# Altium footprint library LUMI_Standard_Auto_Soldering_LIB.PcbLib: 344 footprints (part 8 of 22)
Each footprint in its own frame and in the unit in brackets; x right, y up, seen from the top. Pads: shape width x height; smd on the part's side, far side on the other; paste and mask are expansions set on the pad; w line width, h text height; cw(c..) or ccw(c..) is an arc to the next point about the centre after c.
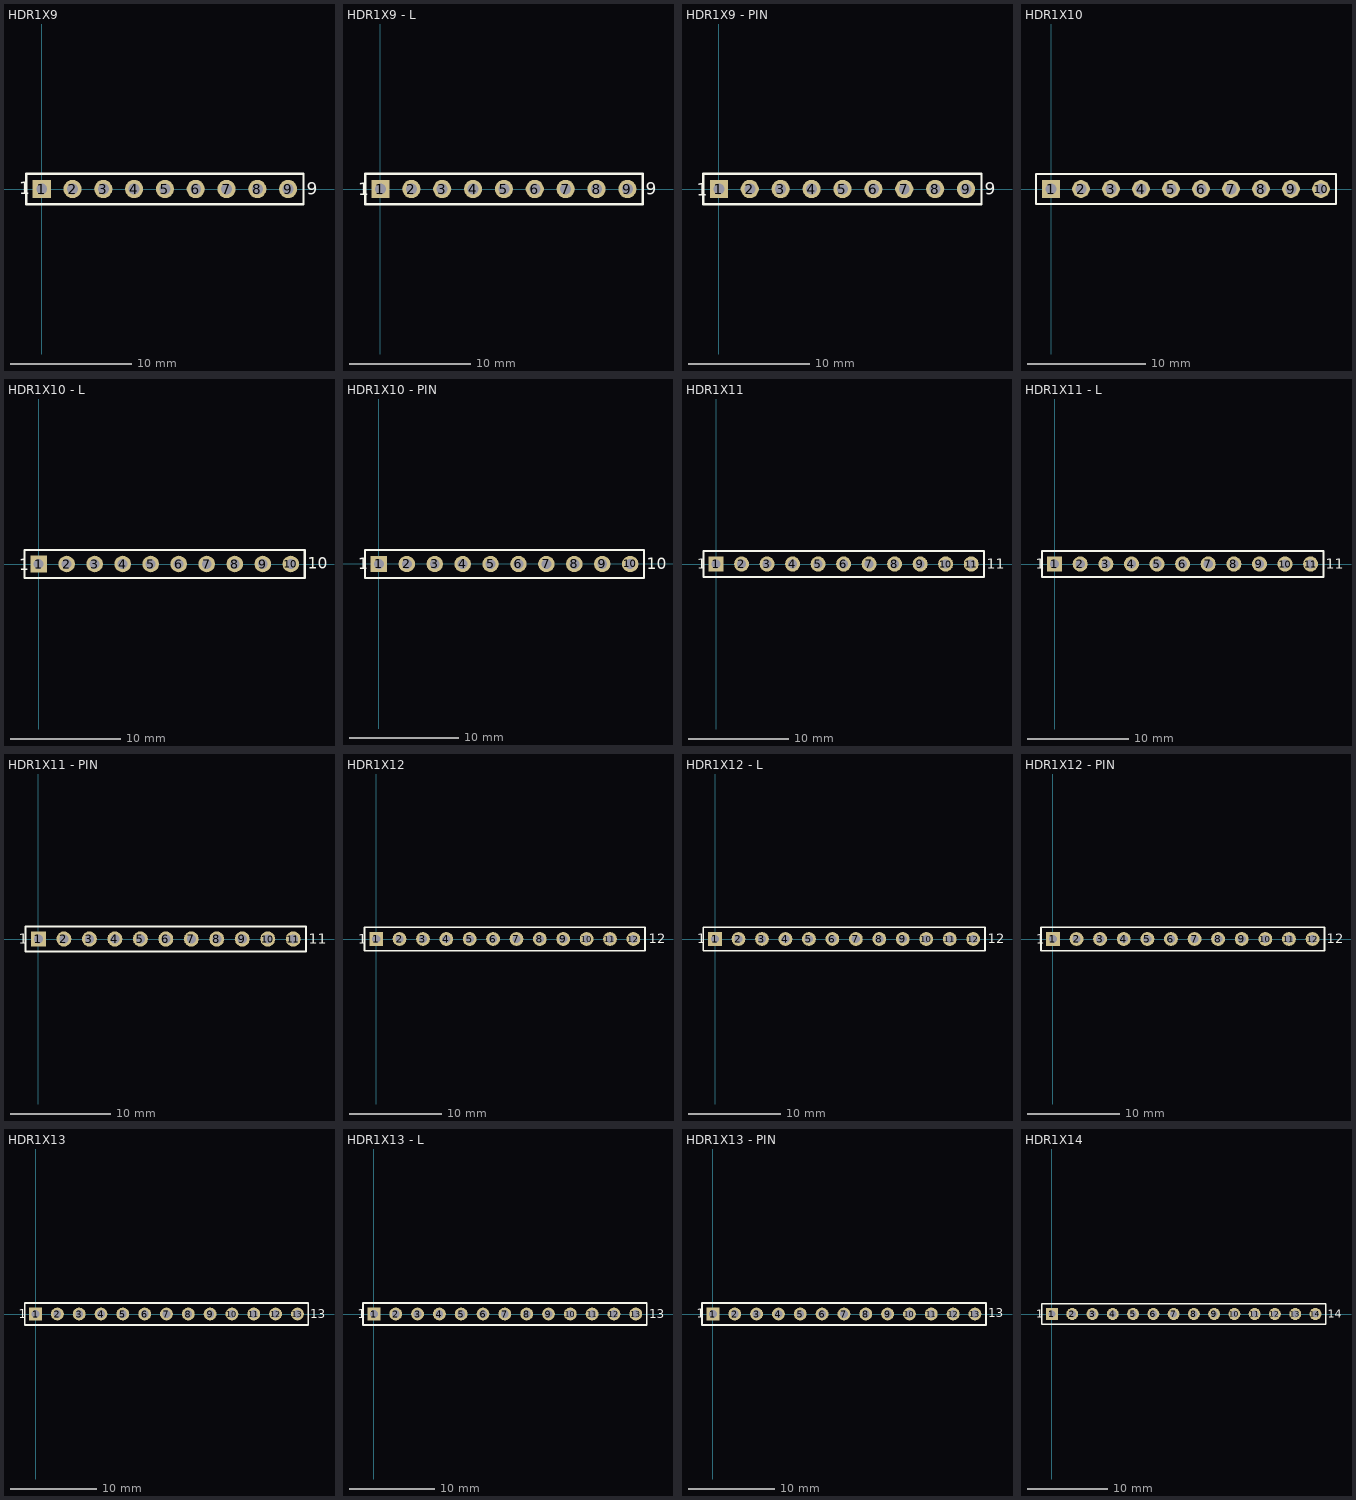
[diagram p7: the footprints below, top view; thin cyan lines are the x and y axes]

## HDR1X9 [mm] "Connector; Header; 9 Position"
pads (9):
  rect 1.5x1.5 hole 0.9: 1(0,0)
  round 1.5 hole 0.9: 2(2.54,0) 3(5.08,0) 4(7.62,0) 5(10.16,0) 6(12.7,0) 7(15.24,0) 8(17.78,0) 9(20.32,0)
Top Overlay:
  lines w0.2: -1.27,-1.27 21.59,-1.27 21.59,1.27 -1.27,1.27 -1.27,-1.27
  text "1" at -1.875,-0.45 h1.02
  text "9" at 21.85,-0.475 h1.02
3D body: height 8.55, standoff -2.43, extent -1.208,-1.314 3.872,1.226
3D body: height 8.55, standoff -2.43, extent 3.785,-1.295 8.865,1.245
3D body: height 8.52, standoff -2.48, extent 8.89,-1.25 21.59,1.25

## HDR1X9 - L [mm] "Connector; Header; 9 Position"
pads (9):
  rect 1.5x1.5 hole 0.9: 1(0,0)
  round 1.5 hole 0.9: 2(2.54,0) 3(5.08,0) 4(7.62,0) 5(10.16,0) 6(12.7,0) 7(15.24,0) 8(17.78,0) 9(20.32,0)
Top Overlay:
  lines w0.2: -1.27,-1.27 21.59,-1.27 21.59,1.27 -1.27,1.27 -1.27,-1.27
  text "9" at 21.825,-0.475 h1.02
  text "1" at -1.85,-0.5 h1.02
3D body: height 4.33, standoff -3, extent 8.89,-1.27 21.59,7
3D body: height 4.33, standoff -3, extent -1.092,-1.265 9.068,7.005

## HDR1X9 - PIN [mm] "Connector; Header; 9 Position"
pads (9):
  rect 1.5x1.5 hole 0.9: 1(0,0)
  round 1.5 hole 0.9: 2(2.54,0) 3(5.08,0) 4(7.62,0) 5(10.16,0) 6(12.7,0) 7(15.24,0) 8(17.78,0) 9(20.32,0)
Top Overlay:
  lines w0.2: -1.27,-1.27 21.59,-1.27 21.59,1.27 -1.27,1.27 -1.27,-1.27
  text "9" at 21.85,-0.475 h1.02
  text "1" at -1.8,-0.55 h1.02
3D body: height 6.02, standoff -3.1, extent -1.143,-1.245 6.477,1.295
3D body: height 6.02, standoff -3.1, extent 6.401,-1.245 14.021,1.295
3D body: height 6.02, standoff -3.1, extent 13.97,-1.245 21.59,1.295

## HDR1X10 [mm] "Connector; Header; 10 Position"
pads (10):
  rect 1.5x1.5 hole 0.9: 1(0,0)
  round 1.5 hole 0.9: 2(2.54,0) 3(5.08,0) 4(7.62,0) 5(10.16,0) 6(12.7,0) 7(15.24,0) 8(17.78,0) 9(20.32,0) 10(22.86,0)
Top Overlay:
  lines w0.2: -1.27,-1.27 -1.27,1.27 0.635,1.27 24.13,1.27 24.13,-1.27 -1.27,-1.27
3D body: height 8.55, standoff -2.43, extent 19.075,-1.27 24.155,1.27
3D body: height 8.55, standoff -2.43, extent 13.995,-1.27 19.075,1.27
3D body: height 8.55, standoff -2.43, extent 8.966,-1.295 14.046,1.245
3D body: height 8.55, standoff -2.43, extent 3.861,-1.295 8.941,1.245
3D body: height 8.55, standoff -2.43, extent -1.118,-1.321 3.962,1.219

## HDR1X10 - L [mm] "Connector; Header; 10 Position"
pads (10):
  rect 1.5x1.5 hole 0.9: 1(0,0)
  round 1.5 hole 0.9: 2(2.54,0) 3(5.08,0) 4(7.62,0) 5(10.16,0) 6(12.7,0) 7(15.24,0) 8(17.78,0) 9(20.32,0) 10(22.86,0)
Top Overlay:
  lines w0.2: -1.27,-1.27 -1.27,1.27 0.635,1.27 24.13,1.27 24.13,-1.27 -1.27,-1.27
  text "10" at 24.4,-0.425 h1.02
  text "1" at -1.775,-0.55 h1.02
3D body: height 4.33, standoff -3, extent 11.43,-1.27 24.13,7
3D body: height 4.33, standoff -3, extent -1.27,-1.27 11.43,7

## HDR1X10 - PIN [mm] "Connector; Header; 10 Position"
pads (10):
  rect 1.5x1.5 hole 0.9: 1(0,0)
  round 1.5 hole 0.9: 2(2.54,0) 3(5.08,0) 4(7.62,0) 5(10.16,0) 6(12.7,0) 7(15.24,0) 8(17.78,0) 9(20.32,0) 10(22.86,0)
Top Overlay:
  lines w0.2: -1.27,-1.27 24.13,-1.27 24.13,1.27 0.635,1.27 -1.27,1.27 -1.27,-1.27
  text "1" at -1.9,-0.475 h1.02
  text "10" at 24.375,-0.475 h1.02
3D body: height 6.02, standoff -3.1, extent 13.919,-1.295 24.079,1.245
3D body: height 6.02, standoff -3.1, extent 6.299,-1.295 13.919,1.245
3D body: height 6.02, standoff -3.1, extent -1.295,-1.27 6.325,1.27

## HDR1X11 [mm] "Connector; Header; 11 Position"
pads (11):
  rect 1.5x1.5 hole 0.9: 1(0,0)
  round 1.5 hole 0.9: 2(2.54,0) 3(5.08,0) 4(7.62,0) 5(10.16,0) 6(12.7,0) 7(15.24,0) 8(17.78,0) 9(20.32,0) 10(22.86,0) 11(25.4,0)
Top Overlay:
  lines w0.2: -1.27,-1.27 -1.27,1.27 0.635,1.27 26.67,1.27 26.67,-1.27 -1.27,-1.27
  text "11" at 26.95,-0.45 h1.02
  text "1" at -1.9,-0.45 h1.02
3D body: height 8.52, standoff -2.48, extent 13.97,-1.25 26.67,1.25
3D body: height 8.55, standoff -2.43, extent 8.901,-1.263 13.981,1.277
3D body: height 8.55, standoff -2.43, extent 3.897,-1.314 8.977,1.226
3D body: height 8.55, standoff -2.43, extent -1.168,-1.346 3.912,1.194

## HDR1X11 - L [mm] "Connector; Header; 11 Position"
pads (11):
  rect 1.5x1.5 hole 0.9: 1(0,0)
  round 1.5 hole 0.9: 2(2.54,0) 3(5.08,0) 4(7.62,0) 5(10.16,0) 6(12.7,0) 7(15.24,0) 8(17.78,0) 9(20.32,0) 10(22.86,0) 11(25.4,0)
Top Overlay:
  lines w0.2: -1.27,-1.27 26.67,-1.27 26.67,1.27 0.635,1.27 -1.27,1.27 -1.27,-1.27
  text "1" at -1.85,-0.45 h1.02
  text "11" at 26.9,-0.475 h1.02
3D body: height 4.33, standoff -3, extent 11.456,-1.27 26.696,7
3D body: height 4.33, standoff -3, extent -1.27,-1.27 11.43,7

## HDR1X11 - PIN [mm] "Connector; Header; 11 Position"
pads (11):
  rect 1.5x1.5 hole 0.9: 1(0,0)
  round 1.5 hole 0.9: 2(2.54,0) 3(5.08,0) 4(7.62,0) 5(10.16,0) 6(12.7,0) 7(15.24,0) 8(17.78,0) 9(20.32,0) 10(22.86,0) 11(25.4,0)
Top Overlay:
  lines w0.2: -1.27,-1.27 -1.27,1.27 0.635,1.27 26.67,1.27 26.67,-1.27 -1.27,-1.27
  text "11" at 26.95,-0.475 h1.02
  text "1" at -1.925,-0.475 h1.02
3D body: height 6.02, standoff -3.1, extent -1.295,-1.27 6.325,1.27
3D body: height 6.02, standoff -3.1, extent 6.325,-1.27 16.485,1.27
3D body: height 6.02, standoff -3.1, extent 16.485,-1.27 26.645,1.27

## HDR1X12 [mm] "Connector; Header; 12 Position"
pads (12):
  rect 1.5x1.5 hole 0.9: 1(0,0)
  round 1.5 hole 0.9: 2(2.54,0) 3(5.08,0) 4(7.62,0) 5(10.16,0) 6(12.7,0) 7(15.24,0) 8(17.78,0) 9(20.32,0) 10(22.86,0) 11(25.4,0) 12(27.94,0)
Top Overlay:
  lines w0.2: -1.27,-1.27 29.21,-1.27 29.21,1.27 0.635,1.27 -1.27,1.27 -1.27,-1.27
  text "1" at -1.975,-0.525 h1.02
  text "12" at 29.6,-0.45 h1.02
3D body: height 8.55, standoff -2.43, extent -1.041,-1.27 4.039,1.27
3D body: height 8.55, standoff -2.43, extent 3.962,-1.295 9.042,1.245
3D body: height 8.55, standoff -2.43, extent 9.079,-1.289 14.159,1.251
3D body: height 8.55, standoff -2.43, extent 14.032,-1.263 19.112,1.277
3D body: height 8.55, standoff -2.43, extent 19.112,-1.289 24.192,1.251
3D body: height 8.55, standoff -2.43, extent 24.105,-1.27 29.185,1.27

## HDR1X12 - L [mm] "Connector; Header; 12 Position"
pads (12):
  rect 1.5x1.5 hole 0.9: 1(0,0)
  round 1.5 hole 0.9: 2(2.54,0) 3(5.08,0) 4(7.62,0) 5(10.16,0) 6(12.7,0) 7(15.24,0) 8(17.78,0) 9(20.32,0) 10(22.86,0) 11(25.4,0) 12(27.94,0)
Top Overlay:
  lines w0.2: -1.27,-1.27 -1.27,1.27 0.635,1.27 29.21,1.27 29.21,-1.27 -1.27,-1.27
  text "12" at 29.5,-0.45 h1.02
  text "1" at -1.95,-0.45 h1.02
3D body: height 4.33, standoff -3, extent -1.27,-1.244 13.97,7.026
3D body: height 4.33, standoff -3, extent 13.97,-1.244 29.21,7.026

## HDR1X12 - PIN [mm] "Connector; Header; 12 Position"
pads (12):
  rect 1.5x1.5 hole 0.9: 1(0,0)
  round 1.5 hole 0.9: 2(2.54,0) 3(5.08,0) 4(7.62,0) 5(10.16,0) 6(12.7,0) 7(15.24,0) 8(17.78,0) 9(20.32,0) 10(22.86,0) 11(25.4,0) 12(27.94,0)
Top Overlay:
  lines w0.2: -1.27,-1.27 29.21,-1.27 29.21,1.27 0.635,1.27 -1.27,1.27 -1.27,-1.27
  text "1" at -1.825,-0.5 h1.02
  text "12" at 29.45,-0.475 h1.02
3D body: height 6.02, standoff -3.1, extent -1.245,-1.27 8.915,1.27
3D body: height 6.02, standoff -3.1, extent 8.89,-1.27 19.05,1.27
3D body: height 6.02, standoff -3.1, extent 18.999,-1.27 29.159,1.27

## HDR1X13 [mm] "Connector; Header; 13 Position"
pads (13):
  rect 1.5x1.5 hole 0.9: 1(0,0)
  round 1.5 hole 0.9: 2(2.54,0) 3(5.08,0) 4(7.62,0) 5(10.16,0) 6(12.7,0) 7(15.24,0) 8(17.78,0) 9(20.32,0) 10(22.86,0) 11(25.4,0) 12(27.94,0) 13(30.48,0)
Top Overlay:
  lines w0.2: -1.27,-1.27 31.75,-1.27 31.75,1.27 0.635,1.27 -1.27,1.27 -1.27,-1.27
  text "13" at 31.975,-0.475 h1.02
  text "1" at -1.925,-0.475 h1.02
3D body: height 8.52, standoff -2.48, extent 19.05,-1.25 31.75,1.25
3D body: height 8.55, standoff -2.43, extent 14.072,-1.27 19.152,1.27
3D body: height 8.55, standoff -2.43, extent 8.966,-1.27 14.046,1.27
3D body: height 8.55, standoff -2.43, extent 3.937,-1.27 9.017,1.27
3D body: height 8.55, standoff -2.43, extent -1.143,-1.346 3.937,1.194

## HDR1X13 - L [mm] "Connector; Header; 13 Position"
pads (13):
  rect 1.5x1.5 hole 0.9: 1(0,0)
  round 1.5 hole 0.9: 2(2.54,0) 3(5.08,0) 4(7.62,0) 5(10.16,0) 6(12.7,0) 7(15.24,0) 8(17.78,0) 9(20.32,0) 10(22.86,0) 11(25.4,0) 12(27.94,0) 13(30.48,0)
Top Overlay:
  lines w0.2: -1.27,-1.27 31.75,-1.27 31.75,1.27 0.635,1.27 -1.27,1.27 -1.27,-1.27
  text "1" at -1.85,-0.5 h1.02
  text "13" at 32.05,-0.5 h1.02
3D body: height 4.33, standoff -3, extent 13.97,-1.27 31.75,7
3D body: height 4.33, standoff -3, extent -1.245,-1.27 13.995,7

## HDR1X13 - PIN [mm] "Connector; Header; 13 Position"
pads (13):
  rect 1.5x1.5 hole 0.9: 1(0,0)
  round 1.5 hole 0.9: 2(2.54,0) 3(5.08,0) 4(7.62,0) 5(10.16,0) 6(12.7,0) 7(15.24,0) 8(17.78,0) 9(20.32,0) 10(22.86,0) 11(25.4,0) 12(27.94,0) 13(30.48,0)
Top Overlay:
  lines w0.2: -1.27,-1.27 31.75,-1.27 31.75,1.27 0.635,1.27 -1.27,1.27 -1.27,-1.27
  text "13" at 32.025,-0.35 h1.02
  text "1" at -1.85,-0.425 h1.02
3D body: height 6.02, standoff -3.1, extent 24.155,-1.245 31.775,1.295
3D body: height 6.02, standoff -3.1, extent 16.535,-1.245 24.155,1.295
3D body: height 6.02, standoff -3.1, extent 8.915,-1.245 16.535,1.295
3D body: height 6.02, standoff -3.1, extent -1.245,-1.245 8.915,1.295

## HDR1X14 [mm] "Connector; Header; 14 Position"
pads (14):
  rect 1.5x1.5 hole 0.9: 1(0,0)
  round 1.5 hole 0.9: 2(2.54,0) 3(5.08,0) 4(7.62,0) 5(10.16,0) 6(12.7,0) 7(15.24,0) 8(17.78,0) 9(20.32,0) 10(22.86,0) 11(25.4,0) 12(27.94,0) 13(30.48,0) 14(33.02,0)
Top Overlay:
  lines w0.2: -1.27,-1.27 34.29,-1.27 34.29,1.27 0.635,1.27 -1.27,1.27 -1.27,-1.27
  text "1" at -2,-0.5 h1.02
  text "14" at 34.575,-0.45 h1.02
3D body: height 8.55, standoff -2.43, extent -1.107,-1.263 3.973,1.277
3D body: height 8.55, standoff -2.43, extent 3.847,-1.263 8.927,1.277
3D body: height 8.55, standoff -2.43, extent 8.825,-1.263 13.905,1.277
3D body: height 8.55, standoff -2.43, extent 13.905,-1.263 18.985,1.277
3D body: height 8.55, standoff -2.43, extent 18.999,-1.27 24.079,1.27
3D body: height 8.55, standoff -2.43, extent 24.079,-1.27 29.159,1.27
3D body: height 8.55, standoff -2.43, extent 29.17,-1.263 34.25,1.277